# Altium footprint library Eis_Lib.PcbLib: 75 footprints (part 2 of 5)
Each footprint in its own frame and in the unit in brackets; x right, y up, seen from the top. Pads: shape width x height; smd on the part's side, far side on the other; paste and mask are expansions set on the pad; w line width, h text height; cw(c..) or ccw(c..) is an arc to the next point about the centre after c.
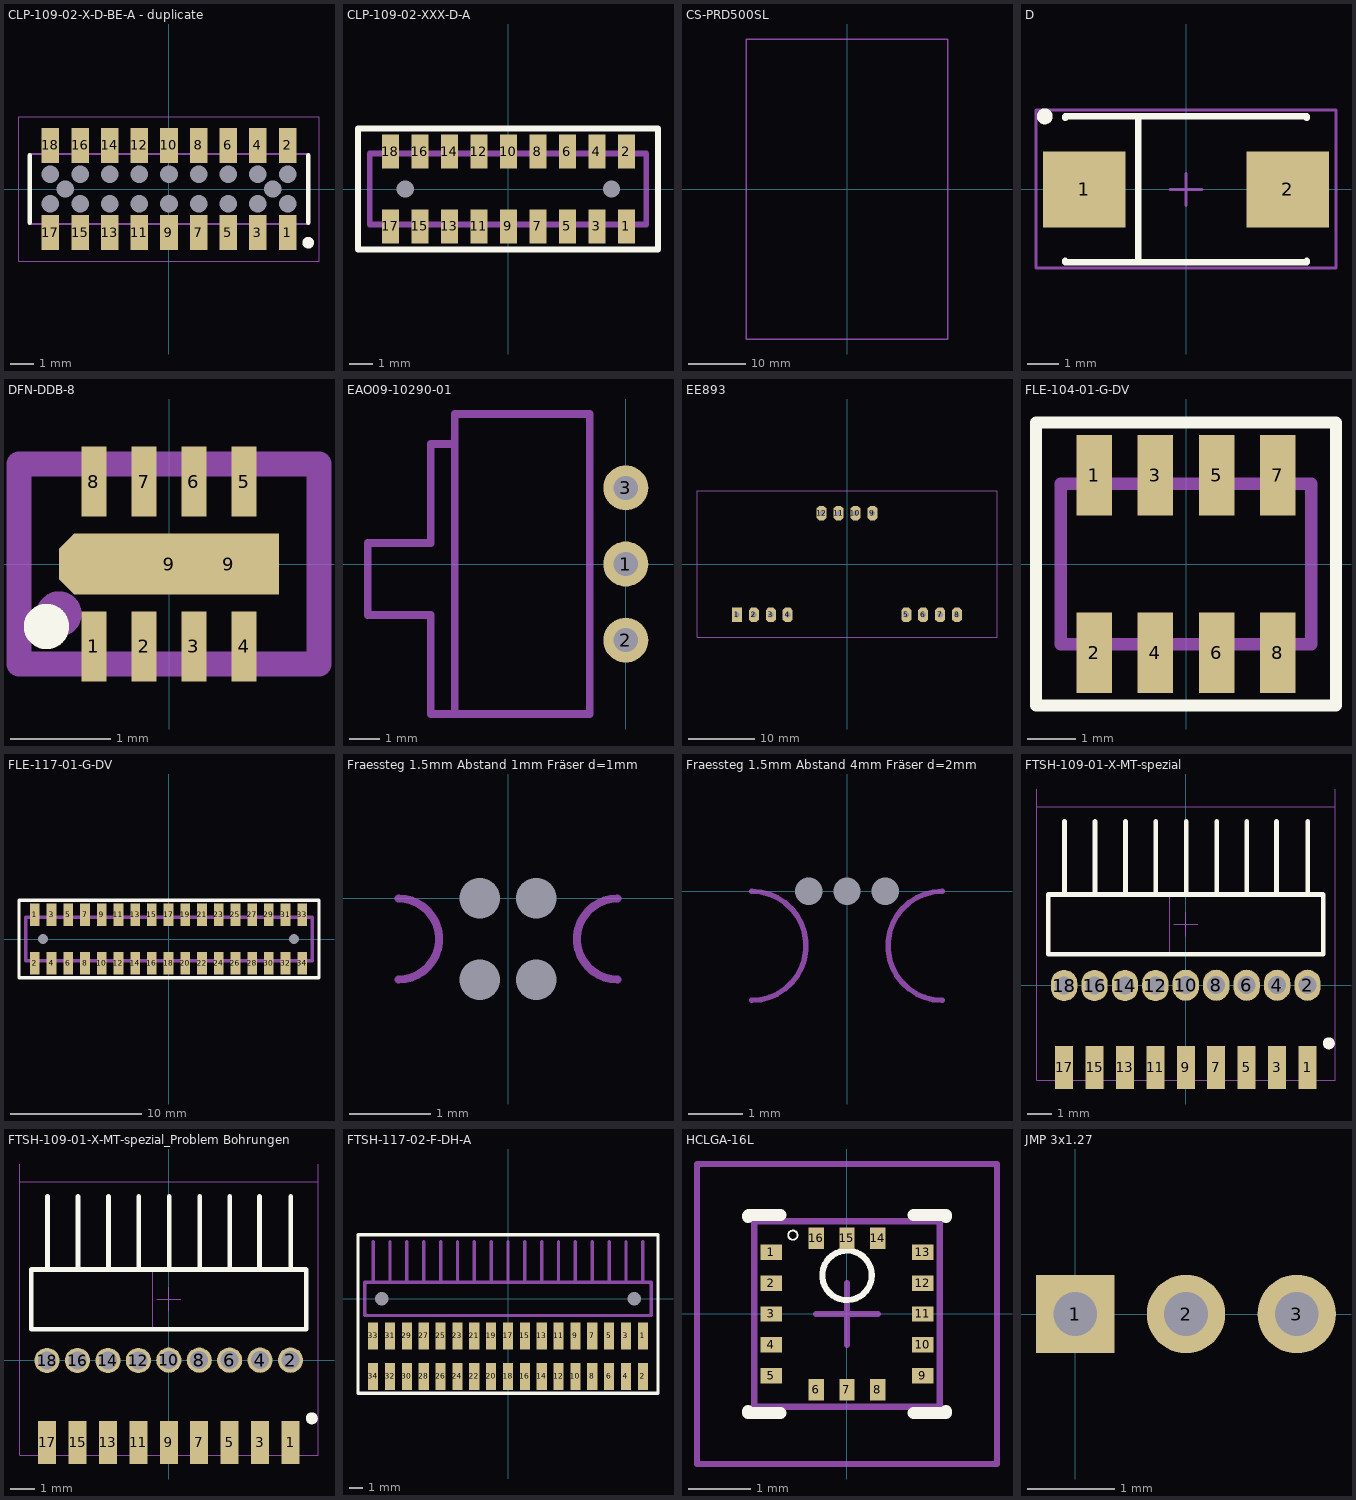
[diagram p1: the footprints below, top view; thin cyan lines are the x and y axes]

## CLP-109-02-X-D-BE-A - duplicate [mm] "1.27mm pitch, 18 pin, socket strip; low profile, vertical"
height 2.26
pads (38):
  rect 0.75x1.5 smd mask+0: 1(5.08,-1.87) 2(5.08,1.87) 3(3.81,-1.87) 4(3.81,1.87) 5(2.54,-1.87) 6(2.54,1.87) 7(1.27,-1.87) 8(1.27,1.87) 9(0,-1.87) 10(0,1.87) 11(-1.27,-1.87) 12(-1.27,1.87) 13(-2.54,-1.87) 14(-2.54,1.87) 15(-3.81,-1.87) 16(-3.81,1.87) 17(-5.08,-1.87) 18(-5.08,1.87)
  round 0 hole 0.74: 100(-4.445,0) 101(4.445,0)
  round 0.5 hole 0.75 unplated mask+0: 183(-5.08,-0.635) 184(-5.08,0.635) 185(-3.81,-0.635) 186(-3.81,0.635) 187(-2.54,-0.635) 188(-2.54,0.635) 189(-1.27,-0.635) 190(-1.27,0.635) 191(0,-0.635) 192(0,0.635) 193(1.27,-0.635) 194(1.27,0.635) 195(2.54,-0.635) 196(2.54,0.635) 197(3.81,-0.635) 198(3.81,0.635) 199(5.08,-0.635) 200(5.08,0.635)
Top Overlay:
  circle w0.25: c5.965,-2.3 r0.125
  lines w0.2: -5.965,-1.45 -5.965,1.45 ; 5.965,-1.45 5.965,1.45
Mechanical 12:
  lines w0.001: -5.965,-1.5 -5.965,1.5 5.965,1.5 5.965,-1.5 -5.965,-1.5
Mechanical 13:
  lines w0.1: -5.969,-1.5 -5.969,1.5 5.965,1.5 5.965,-1.5 -5.969,-1.5
Mechanical 15:
  lines w0.05: -6.426,-3.099 -6.426,3.099 6.426,3.099 6.426,-3.099 -6.426,-3.099
3D body: height 2.27, standoff -0.49, extent -5.931,-2.159 5.931,2.159

## CLP-109-02-XXX-D-A [mil]
pads (20):
  rect 29x58 smd mask+2: 1(200,-63.5) 2(200,63.5) 3(150,-63.5) 4(150,63.5) 5(100,-63.5) 6(100,63.5) 7(50,-63.5) 8(50,63.5) 9(0,-63.5) 10(0,63.5) 11(-50,-63.5) 12(-50,63.5) 13(-100,-63.5) 14(-100,63.5) 15(-150,-63.5) 16(-150,63.5) 17(-200,-63.5) 18(-200,63.5)
  round 0 hole 29 unplated: 21(175,0) 22(-175,0)
Top Overlay:
  lines w10: -255,-102.5 -255,102.5 253.5,102.5 253.5,-102.5 -255,-102.5
Mechanical 1:
  lines w10: -235,-60 -235,60 233.5,60 233.5,-60 -235,-60
  text "J1" at -20,-15 h30

## CS-PRD500SL [mm] "Li-Ion-Akku für Sony Reader eBook, 52x35x3,3mm"
height 3.3
Mechanical 13:
  lines w0.254: -17.5,-26 -17.5,26 17.5,26 17.5,-26 -17.5,-26
3D body: height 3.3, standoff 0, extent -17.499,-25.999 17.499,25.999

## D [mm] "Capacitor, SM Tantalum; Body 7.3 x 4.3 mm (LxW typ)"
height 3.1
pads (2):
  rect 2.6x2.4 smd: 1(-3.2,0) 2(3.2,0)
Top Overlay:
  circle w0.25: c-4.45,2.3 r0.125
  lines w0.2: -3.8,-2.25 -3.8,-2.3 3.8,-2.3 3.8,-2.25 ; -3.8,2.25 -3.8,2.3 3.8,2.3 3.8,2.25 ; -1.5,-2.3 -1.5,2.3
Mechanical 15:
  lines w0.1: -0.5,0 0.5,0 ; 0,-0.5 0,0.5 ; -4.725,-2.475 4.725,-2.475 4.725,2.5 -4.725,2.5 -4.725,-2.475
3D body: height 3.01, standoff 0, extent -3.7,-2.225 3.7,2.225

## DFN-DDB-8 [mm] "DDB Package  8-Lead Plastic DFN (3mm × 2mm)"
height 0.8
pads (10):
  rect 0.25x0.7 smd mask+0: 1(-0.75,-0.825) 2(-0.25,-0.825) 3(0.25,-0.825) 4(0.75,-0.825) 5(0.75,0.825) 6(0.25,0.825) 7(-0.25,0.825) 8(-0.75,0.825)
  oct 2.2x0.61 smd mask+0: 9(0,0)
  rect 1x0.61 smd mask+0: 9(0.6,0)
Top Overlay:
  circle w0.254: c-1.225,-0.625 r0.1
Mechanical 1:
  circle w0.254: c-1.1,-0.5 r0.1
  lines w0.254: -1.5,-1 -1.5,1 1.5,1 1.5,-1 -1.5,-1
3D body: height 0.8, standoff 0.05, extent -1.499,-0.999 1.499,0.999

## EAO09-10290-01 [mm] "Schalter EAO09-10290-01; Rechtwinklig; 3polig; 2,54 mm Raster"
height 2.5
pads (3):
  round 1.5 hole 0.8: 1(0,0) 2(0,-2.54) 3(0,2.54)
Mechanical 13:
  lines w0.254: -5.7,4 -6.5,4 -6.5,0.7 -8.6,0.7 -8.6,-1.7 -6.5,-1.7 -6.5,-5 -5.7,-5 ; -5.7,-5 -5.7,5 -1.2,5 -1.2,-5 -5.7,-5
  text "1-2 auf" at -1.75,-4.7 h1.52
  text "1-3 zu" at -3.85,-4.075 h1.52
3D body: height 2.55, standoff -3.45, extent -8.599,-5.025 0.3,4.975

## EE893 [mm] "CO2-Sensor 22x45x15.3mm"
height 15.3
pads (12):
  rect 1.5x2.2 hole 0.8: 1(-16.51,-7.62)
  oct 1.5x2.2 hole 0.8: 2(-13.97,-7.62) 3(-11.43,-7.62) 4(-8.89,-7.62) 5(8.89,-7.62) 6(11.43,-7.62) 7(13.97,-7.62) 8(16.51,-7.62) 9(3.81,7.62) 10(1.27,7.62) 11(-1.27,7.62) 12(-3.81,7.62)
Mechanical 1:
  lines w0.1: -22.5,-11 22.5,-11 22.5,11 -22.5,11 -22.5,-11
3D body: height 15.25, standoff 0.4, extent -27.355,-10.9 22.555,11.1

## FLE-104-01-G-DV [mil] "Samtec Stecker 8polig 1.27mm Raster"
height 150
pads (8):
  rect 29x66 smd mask+2: 1(-75,72.5) 2(-75,-72.5) 3(-25,72.5) 4(-25,-72.5) 5(25,72.5) 6(25,-72.5) 7(75,72.5) 8(75,-72.5)
Top Overlay:
  lines w10: -122.5,-115.5 -122.5,115.5 122.5,115.5 122.5,-115.5 -122.5,-115.5
Mechanical 1:
  lines w10: -102.25,-65.5 -102.25,65.5 102.25,65.5 102.25,-65.5 -102.25,-65.5
  text "J1" at -20,-10 h30
3D body: height 180, standoff 1, extent -102.25,-91 102.25,90

## FLE-117-01-G-DV [mil] "34plolige Buchse"
height 100
pads (36):
  rect 29x66 smd mask+2: 1(-400,72.5) 2(-400,-72.5) 3(-350,72.5) 4(-350,-72.5) 5(-300,72.5) 6(-300,-72.5) 7(-250,72.5) 8(-250,-72.5) 9(-200,72.5) 10(-200,-72.5) 11(-150,72.5) 12(-150,-72.5) 13(-100,72.5) 14(-100,-72.5) 15(-50,72.5) 16(-50,-72.5) 17(0,72.5) 18(0,-72.5) 19(50,72.5) 20(50,-72.5) 21(100,72.5) 22(100,-72.5) 23(150,72.5) 24(150,-72.5) 25(200,72.5) 26(200,-72.5) 27(250,72.5) 28(250,-72.5) 29(300,72.5) 30(300,-72.5) 31(350,72.5) 32(350,-72.5) 33(400,72.5) 34(400,-72.5)
  round 0 hole 30 unplated: 51(-375,0) 52(375,0)
Top Overlay:
  lines w10: -447.5,-115.5 450,-115.5 450,115.5 -447.5,115.5 -447.5,-115.5
Mechanical 1:
  lines w10: -427.25,-65.5 430,-65.5 430,65.5 -427.25,65.5 -427.25,-65.5
  text "J1" at -15,-15 h30
3D body: height 178, standoff -29, extent -427.25,-90 427.25,91

## Fraessteg 1.5mm Abstand 1mm Fräser d=1mm [mm] "Fraessteg 1.5mm Abstand 4mm Fräser d=2mm"
pads (4):
  round 0 hole 0.5 mask+0: 1(-0.35,0) 2(0.35,0) 3(0.35,-1) 4(-0.35,-1)
Mechanical 2:
  lines w0.1: -1.35,-1 ccw(c-1.35,-0.5) -1.35,0 ; 1.35,-1 cw(c1.35,-0.5) 1.35,0

## Fraessteg 1.5mm Abstand 4mm Fräser d=2mm [mm] "Fraessteg 1.5mm Abstand 4mm Fräser d=2mm"
height 1.75
pads (3):
  round 0 hole 0.5: 1(-0.7,0) 2(0,0) 3(0.7,0)
Mechanical 2:
  lines w0.1: -1.75,-2 ccw(c-1.75,-1) -1.75,0 ; 1.75,-2 cw(c1.75,-1) 1.75,0

## FTSH-109-01-X-MT-spezial [mm] "1.27mm pitch, terminal strip; r/a, w/3.05mm length post, SMT, PTH für CLP-Bottom-Entry (BE-Option)"
height 3.43
pads (18):
  rect 0.75x1.8 smd mask+0: 1(5.08,-3.432) 5(2.54,-3.432) 7(1.27,-3.432) 9(0,-3.432) 11(-1.27,-3.432) 13(-2.54,-3.432) 15(-3.81,-3.432) 17(-5.08,-3.432)
  oval 1.1x1.3 hole 0.75 mask+0: 2(5.08,0) 4(3.81,0) 6(2.54,0) 8(1.27,0) 10(0,0) 12(-1.27,-0.012) 14(-2.54,-0.012) 16(-3.81,-0.012) 18(-5.08,-0.012)
  rect 0.75x1.8 smd paste+0 mask+0: 3(3.81,-3.432)
Top Overlay:
  circle w0.25: c5.969,-2.425 r0.125
  lines w0.2: -5.06,3.79 -5.06,6.84 ; -3.79,3.79 -3.79,6.84 ; -2.52,3.79 -2.52,6.84 ; -1.25,3.79 -1.25,6.84 ; 0.02,3.79 0.02,6.84 ; 1.29,3.79 1.29,6.84 ; 2.54,3.79 2.54,6.84 ; 3.79,3.79 3.79,6.84 ; 5.09,3.79 5.09,6.84 ; -5.74,1.29 5.74,1.29 5.74,3.79 -5.74,3.79 -5.74,1.29
Mechanical 12:
  lines w0.001: -0.66,1.29 5.74,1.29 5.74,3.79 -0.66,3.79 -0.66,1.29
Mechanical 13:
  lines w0.1: -5.08,3.795 -5.08,6.845 ; -3.81,3.795 -3.81,6.845 ; -2.54,3.795 -2.54,6.845 ; -1.27,3.795 -1.27,6.845 ; -0.01,3.795 -0.01,6.845 ; 1.29,3.795 1.29,6.845 ; 2.54,3.795 2.54,6.845 ; 3.79,3.795 3.79,6.845 ; 5.09,3.795 5.09,6.845 ; -5.74,1.29 5.74,1.29 5.74,3.79 -5.74,3.79 -5.74,1.29
Mechanical 15:
  lines w0.05: -6.223,7.44 6.24,7.44 ; -6.223,8.19 -6.223,-3.96 6.24,-3.96 6.24,8.19 ; -0.508,2.54 0.492,2.54 ; 0,2.04 0,3.04
3D body: height 3.46, standoff -2.25, extent -5.689,-4.127 5.741,7.532

## FTSH-109-01-X-MT-spezial_Problem Bohrungen [mm] "1.27mm pitch, terminal strip; r/a, w/3.05mm length post, SMT, PTH für CLP-Bottom-Entry (BE-Option)"
height 3.43
pads (18):
  rect 0.75x1.8 smd mask+0: 1(5.08,-3.432) 5(2.54,-3.432) 7(1.27,-3.432) 9(0,-3.432) 11(-1.27,-3.432) 13(-2.54,-3.432) 15(-3.81,-3.432) 17(-5.08,-3.432)
  round 1.05 hole 0.75 mask+0: 2(5.08,0) 4(3.81,0) 6(2.54,0) 8(1.27,0) 10(0,0) 12(-1.27,-0.012) 14(-2.54,-0.012) 16(-3.81,-0.012) 18(-5.08,-0.012)
  rect 0.75x1.8 smd paste+0 mask+0: 3(3.81,-3.432)
Top Overlay:
  circle w0.25: c5.969,-2.425 r0.125
  lines w0.2: -5.06,3.79 -5.06,6.84 ; -3.79,3.79 -3.79,6.84 ; -2.52,3.79 -2.52,6.84 ; -1.25,3.79 -1.25,6.84 ; 0.02,3.79 0.02,6.84 ; 1.29,3.79 1.29,6.84 ; 2.54,3.79 2.54,6.84 ; 3.79,3.79 3.79,6.84 ; 5.09,3.79 5.09,6.84 ; -5.74,1.29 5.74,1.29 5.74,3.79 -5.74,3.79 -5.74,1.29
Mechanical 12:
  lines w0.001: -0.66,1.29 5.74,1.29 5.74,3.79 -0.66,3.79 -0.66,1.29
Mechanical 13:
  lines w0.1: -5.08,3.795 -5.08,6.845 ; -3.81,3.795 -3.81,6.845 ; -2.54,3.795 -2.54,6.845 ; -1.27,3.795 -1.27,6.845 ; -0.01,3.795 -0.01,6.845 ; 1.29,3.795 1.29,6.845 ; 2.54,3.795 2.54,6.845 ; 3.79,3.795 3.79,6.845 ; 5.09,3.795 5.09,6.845 ; -5.74,1.29 5.74,1.29 5.74,3.79 -5.74,3.79 -5.74,1.29
Mechanical 15:
  lines w0.05: -6.223,7.44 6.24,7.44 ; -6.223,8.19 -6.223,-3.96 6.24,-3.96 6.24,8.19 ; -0.508,2.54 0.492,2.54 ; 0,2.04 0,3.04
3D body: height 3.46, standoff -2.25, extent -5.689,-4.127 5.741,7.532

## FTSH-117-02-F-DH-A [mil] "FTSH-117-02-F-DH-A, 1,27mm Raster passt zu FLE-Typ"
pads (36):
  rect 30x80 smd mask+2: 1(400,-110) 2(400,-230) 3(350,-110) 4(350,-230) 5(300,-110) 6(300,-230) 7(250,-110) 8(250,-230) 9(200,-110) 10(200,-230) 11(150,-110) 12(150,-230) 13(100,-110) 14(100,-230) 15(50,-110) 16(50,-230) 17(0,-110) 18(0,-230) 19(-50,-110) 20(-50,-230) 21(-100,-110) 22(-100,-230) 23(-150,-110) 24(-150,-230) 25(-200,-110) 26(-200,-230) 27(-250,-110) 28(-250,-230) 29(-300,-110) 30(-300,-230) 31(-350,-110) 32(-350,-230) 33(-400,-110) 34(-400,-230)
  round 0 hole 40 unplated: H1(375,0) H2(-375,0)
Top Overlay:
  lines w10: -445,-280 -445,190 445,190 445,-280 -445,-280
Mechanical 1:
  lines w10: -400,49.5 -400,169.5 ; -350,49.5 -350,169.5 ; -300,49.5 -300,169.5 ; -250,49.5 -250,169.5 ; -200,49.5 -200,169.5 ; -150,49.5 -150,169.5 ; -100,49.5 -100,169.5 ; -50,49.5 -50,169.5 ; 0,49.5 0,169.5 ; 50,49.5 50,169.5 ; 100,49.5 100,169.5 ; 150,49.5 150,169.5 ; 200,49.5 200,169.5 ; 250,49.5 250,169.5 ; 300,49.5 300,169.5 ; 350,49.5 350,169.5 ; 400,49.5 400,169.5 ; -425,-49.5 -425,49.5 425,49.5 425,-49.5 -425,-49.5
  text "J1" at -20,-15 h30
3D body: height 137.5, standoff -37.5, extent -424.99,-259.99 425,124.01

## HCLGA-16L [mm] "LPS331AP-Drucksensor, 16-Pins, Body 3,2x3,2mm (max), Pitch 0,50mm, IPC Medium Density"
height 1
pads (16):
  rect 0.35x0.25 smd: 1(-1.225,1) 2(-1.225,0.5) 3(-1.225,0) 4(-1.225,-0.5) 5(-1.225,-1) 9(1.225,-1) 10(1.225,-0.5) 11(1.225,0) 12(1.225,0.5) 13(1.225,1)
  rect 0.25x0.35 smd mask+0.102: 6(-0.5,-1.225) 7(0,-1.225) 8(0.5,-1.225) 14(0.5,1.225) 15(0,1.225) 16(-0.5,1.225)
Top Overlay:
  circle w0.1: c0,0.625 r0.4
  circle w0.03: c-0.875,1.275 r0.075
  lines w0.2: -1.6,-1.575 -1.6,-1.6 -1.075,-1.6 ; -1.6,1.575 -1.6,1.587 -1.587,1.6 -1.075,1.6 ; 1.075,-1.6 1.6,-1.6 1.6,-1.575 ; 1.075,1.6 1.6,1.6 1.6,1.575
Mechanical 13:
  lines w0.1: -1.5,-1.5 -1.5,1.488 -1.488,1.5 1.5,1.5 1.5,-1.5 -1.5,-1.5
Mechanical 15:
  lines w0.1: -0.5,0 0.5,0 ; 0,-0.5 0,0.5 ; -2.425,-2.425 -2.425,2.425 2.425,2.425 2.425,-2.425 -2.425,-2.425
3D body: height 1.02, standoff -0.04, extent -1.5,-1.5 1.5,1.5

## JMP 3x1.27 [mm]
pads (3):
  rect 0.9x0.9 hole 0.5: 1(0,0)
  round 0.9 hole 0.5: 2(1.27,0) 3(2.54,0)